# Altium footprint library L21.PcbLib: 9 footprints
Each footprint in its own frame and in the unit in brackets; x right, y up, seen from the top. Pads: shape width x height; smd on the part's side, far side on the other; paste and mask are expansions set on the pad; w line width, h text height; cw(c..) or ccw(c..) is an arc to the next point about the centre after c.
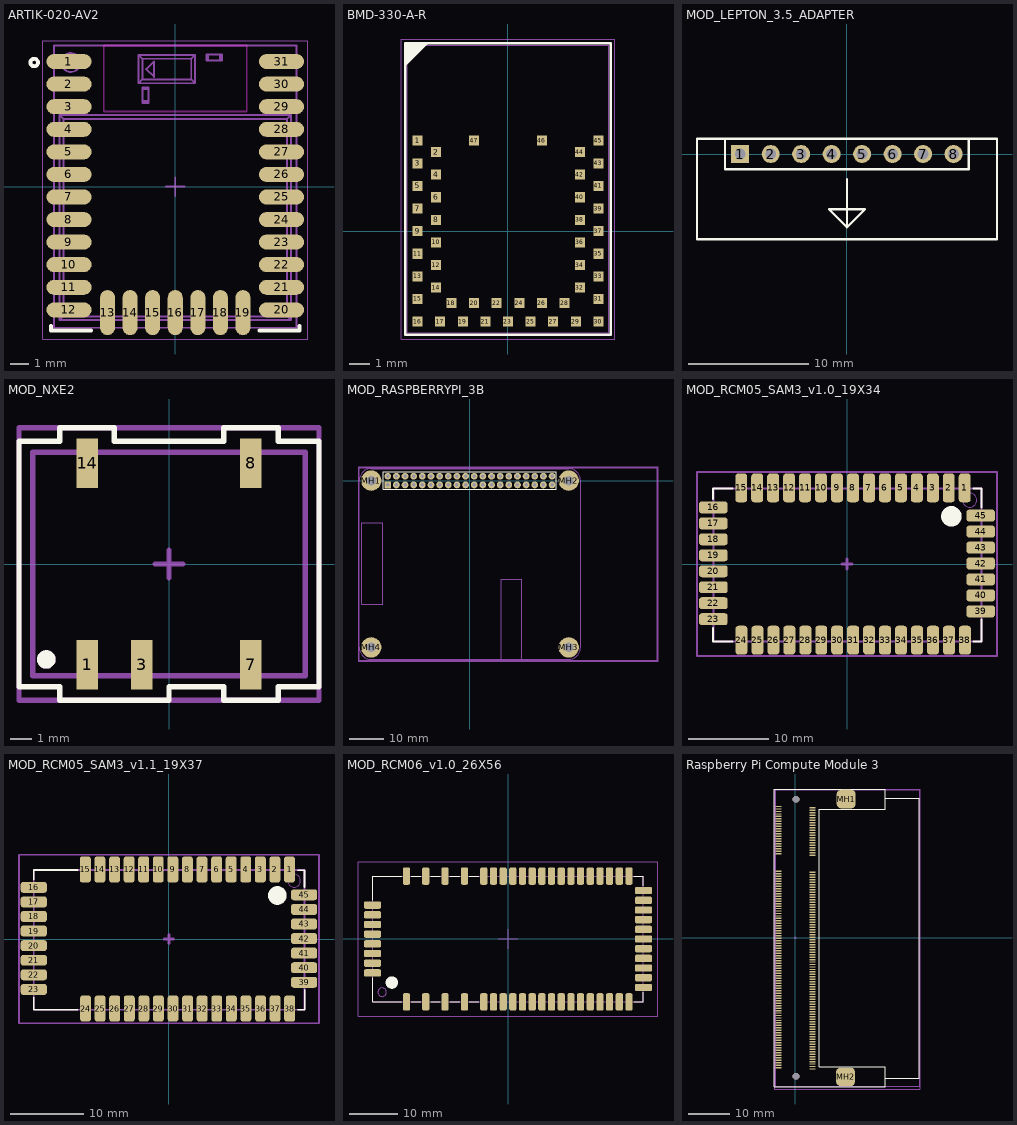
[diagram p0: the footprints below, top view; thin cyan lines are the x and y axes]

## ARTIK-020-AV2 [mm]
pads (31):
  oval 2.4x0.8 smd: 1(-5.65,6.65) 2(-5.65,5.45) 3(-5.65,4.25) 4(-5.65,3.05) 5(-5.65,1.85) 6(-5.65,0.65) 7(-5.65,-0.55) 8(-5.65,-1.75) 9(-5.65,-2.95) 10(-5.65,-4.15) 11(-5.65,-5.35) 12(-5.65,-6.55) 20(5.65,-6.55) 21(5.65,-5.35) 22(5.65,-4.15) 23(5.65,-2.95) 24(5.65,-1.75) 25(5.65,-0.55) 26(5.65,0.65) 27(5.65,1.85) 28(5.65,3.05) 29(5.65,4.25) 30(5.65,5.45) 31(5.65,6.65)
  oval 0.8x2.4 smd: 13(-3.6,-6.7) 14(-2.4,-6.7) 15(-1.2,-6.7) 16(0,-6.7) 17(1.2,-6.7) 18(2.4,-6.7) 19(3.6,-6.7)
Top Overlay:
  circle w0.2: c-7.5,6.6 r0.2
  lines w0.2: -6.6,-7.4 -6.6,-7.65 -4.475,-7.65 ; 4.475,-7.65 6.6,-7.65 6.6,-7.4
Keep-Out Layer:
  lines w0.1: -3.8,4 3.8,4 3.8,7.5 -3.8,7.5 -3.8,4
Assembly Top:
  circle w0.1: c-5.55,6.6 r0.5
  lines w0.1: -6.15,-7.1 -6.15,3.8 ; -6.15,-7.1 -5.95,-6.9 ; -6.15,-7.1 6.15,-7.1 ; -6.15,3.8 -5.95,3.6 ; -6.15,3.8 6.15,3.8 ; -5.95,-6.9 -5.95,3.6 ; -5.95,-6.9 5.95,-6.9 ; -5.95,3.6 5.95,3.6 ; -1.95,5.5 -1.75,5.7 ; -1.95,5.5 -1.95,7 ; -1.95,5.5 1.05,5.5 ; -1.95,7 -1.75,6.8 ; -1.95,7 1.05,7 ; -1.75,5.7 -1.75,6.8 ; -1.75,5.7 0.85,5.7 ; -1.75,6.8 0.85,6.8 ; -1.737,4.546 -1.737,4.446 -1.418,4.446 -1.418,4.546 ; -1.737,4.546 -1.418,4.546 ; -1.737,4.546 -1.737,5.181 ; -1.737,5.181 -1.737,5.281 -1.418,5.281 -1.418,5.181 ; -1.737,5.181 -1.418,5.181 ; -1.418,4.546 -1.418,5.181 ; 0.85,5.7 1.05,5.5 ; 0.85,5.7 0.85,6.8 ; 0.85,6.8 1.05,7 ; 1.05,5.5 1.05,7 ; 1.747,6.7 1.647,6.7 1.647,7.019 1.747,7.019 ; 1.747,6.7 1.747,7.019 ; 1.747,6.7 2.382,6.7 ; 1.747,7.019 2.382,7.019 ; 2.382,6.7 2.482,6.7 2.482,7.019 2.382,7.019 ; 2.382,6.7 2.382,7.019 ; 5.95,-6.9 5.95,3.6 ; 5.95,-6.9 6.15,-7.1 ; 5.95,3.6 6.15,3.8 ; 6.15,-7.1 6.15,3.8 ; -6.45,-7.5 -6.45,7.5 6.45,7.5 6.45,-7.5 -6.45,-7.5 ; -1.545,6.25 -1.129,6.666 -1.129,5.834 -1.545,6.25
Courtyard Top:
  lines w0.05: -7.035,-8.1 7.035,-8.1 7.035,7.75 -7.035,7.75 -7.035,-8.1
  lines w0.1: -0.5,0 0.5,0 ; 0,-0.5 0,0.5
3D body "User Library-BGM111-1.STEP": height 2.21, standoff 0, extent -6.45,-7.525 6.45,7.475

## BMD-330-A-R [mm] "Bluetooth Modulee (802.15.1) BMD-330-A-R"
pads (47):
  rect 0.49x0.49 smd: 1(-4.4,4.4) 2(-3.5,3.85) 3(-4.4,3.3) 4(-3.5,2.75) 5(-4.4,2.2) 6(-3.5,1.65) 7(-4.4,1.1) 8(-3.5,0.55) 9(-4.4,0) 10(-3.5,-0.55) 11(-4.4,-1.1) 12(-3.5,-1.65) 13(-4.4,-2.2) 14(-3.5,-2.75) 15(-4.4,-3.3) 16(-4.4,-4.4) 17(-3.3,-4.4) 18(-2.75,-3.5) 19(-2.2,-4.4) 20(-1.65,-3.5) 21(-1.1,-4.4) 22(-0.55,-3.5) 23(0,-4.4) 24(0.55,-3.5) 25(1.1,-4.4) 26(1.65,-3.5) 27(2.2,-4.4) 28(2.75,-3.5) 29(3.3,-4.4) 30(4.4,-4.4) 31(4.4,-3.3) 32(3.5,-2.75) 33(4.4,-2.2) 34(3.5,-1.65) 35(4.4,-1.1) 36(3.5,-0.55) 37(4.4,0) 38(3.5,0.55) 39(4.4,1.1) 40(3.5,1.65) 41(4.4,2.2) 42(3.5,2.75) 43(4.4,3.3) 44(3.5,3.85) 45(4.4,4.4) 46(1.65,4.4) 47(-1.65,4.4)
Top Overlay:
  region: -4.975,8.125 -3.975,9.125 -4.975,9.125
  lines w0.127: -4.967,8.123 -3.967,9.123 ; -5,-5.05 -5,9.15 5,9.15 5,-5.05 -5,-5.05
Assembly Top:
  lines w0.05: -4.9,-4.95 -4.9,9.05 4.9,9.05 4.9,-4.95 -4.9,-4.95
3D Body Top:
  lines w0.05: -5.2,-5.25 -5.2,9.35 5.2,9.35 5.2,-5.25 -5.2,-5.25
Multi-Layer:
  pour cut-out: -4.9,4.65 4.9,4.65 4.9,9.05 -4.9,9.05
3D body "BMD-300_assembly.STEP": height 1.89, standoff 0.05, extent -4.9,-4.95 4.9,9.05

## MOD_LEPTON_3.5_ADAPTER [mm]
pads (8):
  rect 1.5x1.5 hole 0.9: 1(-8.89,0)
  round 1.5 hole 0.9: 2(-6.35,0) 3(-3.81,0) 4(-1.27,0) 5(1.27,0) 6(3.81,0) 7(6.35,0) 8(8.89,0)
Top Overlay:
  lines w0.2: 0.01,-2.1 0.01,-6.1 ; -10.16,1.27 10.16,1.27 ; -10.16,1.27 -10.16,-1.27 10.16,-1.27 10.16,1.27 ; -10.16,1.27 -12.49,1.27 -12.49,-7.1 12.51,-7.1 12.51,1.27 10.16,1.27 ; 0.01,-6.1 -1.49,-4.6 1.51,-4.6 0.01,-6.1
Mechanical 17:
  text "'.Designator'" at -9.282,-0.479 h1
Mechanical 19:
  text "'.Comment'" at -9.282,-0.479 h1
3D body "User Library-Header _Fem_1X8.step": height 8.5, standoff -3.2, extent -10.414,-1.27 10.406,1.27
3D body "LeptonAdaptor.step": height 32.7, standoff 2.64, extent -12.5,-7.112 12.5,1.314

## MOD_NXE2 [mm]
pads (5):
  rect 1x2.3 smd: 1(-3.81,-4.7) 3(-1.27,-4.7) 7(3.81,-4.7) 8(3.81,4.7) 14(-3.81,4.7)
Top Overlay:
  circle w0.5: c-5.715,-4.445 r0.18
  lines w0.254: -6.985,-5.715 -5.08,-5.715 -5.08,-6.35 0,-6.35 0,-5.715 2.54,-5.715 2.54,-6.35 5.08,-6.35 5.08,-5.715 6.985,-5.715 6.985,5.715 5.08,5.715 5.08,6.35 2.54,6.35 2.54,5.715 -2.54,5.715 -2.54,6.35 -5.08,6.35 -5.08,5.715 -6.985,5.715 -6.985,-5.715
Mechanical 13:
  circle w0.5: c-5.715,-4.445 r0.18
  lines w0.254: -6.35,-5.207 -6.35,5.207 6.35,5.207 6.35,-5.207 -6.35,-5.207
Mechanical 15:
  lines w0.254: -0.635,0 0.635,0 ; 0,-0.635 0,0.635 ; -6.985,-6.35 6.985,-6.35 6.985,6.35 -6.985,6.35 -6.985,-6.35
Mechanical 17:
  text "'.Designator'" at -2.54,-0.254 h0.64
Mechanical 19:
  text "'.Comment'" at -2.54,-1.524 h0.64
3D body "mps_dcdc_nxe2s_mc_a.step": height 4.41, standoff 0, extent -6.35,-5.207 6.35,5.207

## MOD_RASPBERRYPI_3B [mm]
pads (44):
  rect 2x2 hole 1.02: 1(-24.13,-1.27)
  round 2 hole 1.02: 2(-24.13,1.27) 3(-21.59,-1.27) 4(-21.59,1.27) 5(-19.05,-1.27) 6(-19.05,1.27) 7(-16.51,-1.27) 8(-16.51,1.27) 9(-13.97,-1.27) 10(-13.97,1.27) 11(-11.43,-1.27) 12(-11.43,1.27) 13(-8.89,-1.27) 14(-8.89,1.27) 15(-6.35,-1.27) 16(-6.35,1.27) 17(-3.81,-1.27) 18(-3.81,1.27) 19(-1.27,-1.27) 20(-1.27,1.27) 21(1.27,-1.27) 22(1.27,1.27) 23(3.81,-1.27) 24(3.81,1.27) 25(6.35,-1.27) 26(6.35,1.27) 27(8.89,-1.27) 28(8.89,1.27) 29(11.43,-1.27) 30(11.43,1.27) 31(13.97,-1.27) 32(13.97,1.27) 33(16.51,-1.27) 34(16.51,1.27) 35(19.05,-1.27) 36(19.05,1.27) 37(21.59,-1.27) 38(21.59,1.27) 39(24.13,-1.27) 40(24.13,1.27)
  round 6 hole 2.75: MH1(-29,0) MH2(29,0) MH3(29,-49) MH4(-29,-49)
Top Overlay:
  lines w0.2: -25.4,-2.54 -25.4,2.54 -20.955,2.54 25.4,2.54 25.4,-2.54 -25.4,-2.54
Mechanical 13:
  lines w0.127: -32.715,-52.75 -32.715,3.75 55,3.75 55,-52.75 -32.715,-52.75
  lines w0.15: -32.5,-49 ccw(c-29,-49) -29,-52.5 29,-52.5 ccw(c29,-49) 32.5,-49 32.5,0 ccw(c29,0) 29,3.5 -29,3.5 ccw(c-29,0) -32.5,0 -32.5,-49 ; -31.8,-36.322 -31.8,-12.319 -25.654,-12.319 -25.654,-36.322 -31.8,-36.322 ; 9.271,-52.959 9.271,-28.956 15.24,-28.956 15.24,-52.959 9.271,-52.959
  text "CAMERA" at 13.081,-45.593 h1.52
  text "DISPLAY" at -28.067,-30.099 h1.52
Mechanical 15:
  lines w0.127: -32.868,-53 55.25,-53 55.25,4 -32.868,4 -32.868,-53
Mechanical 17:
  text "'.Designator'" at -25.25,-53.25 h1
Mechanical 19:
  text "'.Comment'" at -13.5,-53.25 h1
3D body "Raspberry Pi 3.STEP": height 8.49, standoff -10.1, extent -34.773,-53.831 54.864,3.48

## MOD_RCM05_SAM3_v1.0_19X34 [mm]
pads (45):
  rrect50% 1.5x3.6 smd paste-2.54: 1(14.75,9.538) 2(12.75,9.538) 3(10.75,9.538) 4(8.75,9.538) 5(6.75,9.538) 6(4.75,9.538) 7(2.75,9.538) 8(0.75,9.538) 9(-1.25,9.538) 10(-3.25,9.538) 11(-5.25,9.538) 12(-7.25,9.538) 13(-9.25,9.538) 14(-11.25,9.538) 15(-13.25,9.538) 24(-13.225,-9.538) 25(-11.225,-9.537) 26(-9.225,-9.538) 27(-7.225,-9.538) 28(-5.225,-9.538) 29(-3.225,-9.538) 30(-1.225,-9.537) 31(0.775,-9.538) 32(2.775,-9.538) 33(4.775,-9.538) 34(6.775,-9.538) 35(8.775,-9.538) 36(10.775,-9.538) 37(12.775,-9.538) 38(14.775,-9.538)
  rrect50% 3.6x1.5 smd paste-2.54: 16(-16.75,7.087) 17(-16.75,5.087) 18(-16.75,3.087) 19(-16.75,1.087) 20(-16.75,-0.913) 21(-16.75,-2.913) 22(-16.75,-4.913) 23(-16.75,-6.913) 39(16.75,-5.937) 40(16.75,-3.938) 41(16.75,-1.938) 42(16.75,0.062) 43(16.75,2.063) 44(16.75,4.062) 45(16.75,6.062)
Top Overlay:
  circle w1.27: c13.081,5.969 r0.648
  lines w0.254: -16.806,8.128 -16.806,9.441 ; -16.806,9.467 -14.351,9.467 ; -16.781,-8.001 -16.781,-9.711 -14.351,-9.711 ; 15.875,-9.711 16.839,-9.711 16.839,-6.985 ; 15.875,9.434 16.828,9.434 16.828,7.112
Mechanical 13:
  circle w0.127: c15.367,8.001 r0.889
  lines w0.254: -16.75,9.467 16.8,9.467 ; -16.75,9.471 -16.75,-9.711 16.825,-9.711 16.825,9.446
Mechanical 15:
  lines w0.254: -18.796,-11.557 -18.796,11.557 18.796,11.557 18.796,-11.557 -18.796,-11.557
  lines w0.381: -0.635,0 0.635,0 ; 0,-0.635 0,0.635
Mechanical 17:
  text ".Designator" at -6.985,-1.905 h3.81
Mechanical 19:
  text "'.Comment'" at -9.525,-1.905 h3.81
3D body "RCM-05-SAM3.step": height 2.34, standoff 0.08, extent -17.739,-10.534 17.793,10.466

## MOD_RCM05_SAM3_v1.1_19X37 [mm]
pads (45):
  rrect50% 1.5x3.6 smd paste-2.54: 1(16.535,9.538) 2(14.535,9.538) 3(12.535,9.538) 4(10.535,9.538) 5(8.535,9.538) 6(6.535,9.538) 7(4.535,9.538) 8(2.535,9.538) 9(0.535,9.538) 10(-1.465,9.538) 11(-3.465,9.538) 12(-5.465,9.538) 13(-7.465,9.538) 14(-9.465,9.538) 15(-11.465,9.538) 24(-11.44,-9.537) 25(-9.44,-9.537) 26(-7.44,-9.537) 27(-5.44,-9.537) 28(-3.44,-9.537) 29(-1.44,-9.537) 30(0.56,-9.537) 31(2.56,-9.537) 32(4.56,-9.537) 33(6.56,-9.537) 34(8.56,-9.537) 35(10.56,-9.537) 36(12.56,-9.537) 37(14.56,-9.537) 38(16.56,-9.537)
  rrect50% 3.6x1.5 smd paste-2.54: 16(-18.535,7.087) 17(-18.535,5.087) 18(-18.535,3.087) 19(-18.535,1.087) 20(-18.535,-0.913) 21(-18.535,-2.913) 22(-18.535,-4.913) 23(-18.535,-6.913) 39(18.535,-5.937) 40(18.535,-3.937) 41(18.535,-1.937) 42(18.535,0.063) 43(18.535,2.063) 44(18.535,4.063) 45(18.535,6.063)
Top Overlay:
  circle w1.27: c14.866,5.969 r0.648
  lines w0.254: -18.54,-8.001 -18.54,-9.711 -12.566,-9.711 ; -18.54,8.128 -18.54,9.467 -12.566,9.467 ; 17.66,-9.711 18.624,-9.711 18.624,-6.985 ; 17.66,9.434 18.613,9.434 18.613,7.112
Mechanical 13:
  circle w0.127: c17.152,8.001 r0.889
  lines w0.254: 18.585,9.467 -18.535,9.467 -18.535,-9.711 18.61,-9.711 18.61,9.446
Mechanical 15:
  lines w0.254: -20.567,-11.557 -20.567,11.557 20.581,11.557 20.581,-11.557 -20.567,-11.557
  lines w0.381: -0.635,0 0.635,0 ; 0,-0.635 0,0.635
Mechanical 17:
  text "'.Designator'" at -17.145,2.286 h2.54
Mechanical 19:
  text "'.Comment'" at -17.272,-2.667 h2.54
3D body "RCM-05-SAM3.step": height 2.6, standoff 0.08, extent -19.51,-10.533 19.578,10.467

## MOD_RCM06_v1.0_26X56 [mm]
pads (59):
  rrect50% 1.5x3.6 smd paste-100: 1(-21,-13) 2(-17,-13) 3(-13,-13) 4(-9,-13) 5(-5,-13) 6(-3,-13) 7(-1,-13) 8(1,-13) 9(3,-13) 10(5,-13) 11(7,-13) 12(9,-13) 13(11,-13) 14(13,-13) 15(15,-13) 16(17,-13) 17(19,-13) 18(21,-13) 19(23,-13) 20(25,-13) 32(25,13) 33(23,13) 34(21,13) 35(19,13) 36(17,13) 37(15,13) 38(13,13) 39(11,13) 40(9,13) 41(7,13) 42(5,13) 43(3,13) 44(1,13) 45(-1,13) 46(-3,13) 47(-5,13) 48(-9,13) 49(-13,13) 50(-17,13) 51(-21,13)
  rrect50% 3.6x1.5 smd paste-100: 21(28,-10) 22(28,-8) 23(28,-6) 24(28,-4) 25(28,-2) 26(28,0) 27(28,2) 28(28,4) 29(28,6) 30(28,8) 31(28,10) 52(-28,7) 53(-28,5) 54(-28,3) 55(-28,1) 56(-28,-1) 57(-28,-3) 58(-28,-5) 59(-28,-7)
Top Overlay:
  circle w1.27: c-24,-9 r0.648
  lines w0.254: -28,-8 -28,-13 -22,-13 ; -28,8 -28,13 -22,13 ; -20,-13 -18,-13 ; -20,13 -18,13 ; -16,-13 -14,-13 ; -16,13 -14,13 ; -12,-13 -10,-13 ; -12,13 -10,13 ; -8,-13 -6,-13 ; -8,13 -6,13 ; 26,-13 28,-13 28,-11 ; 26,13 28,13 28,11
Mechanical 13:
  circle w0.127: c-26,-11 r0.889
  lines w0.254: -28,-13 -28,13 28,13 28,-13 -28,-13
Mechanical 15:
  lines w0.254: -2,0 2,0 ; 0,-2 0,2 ; -31,-16 -31,16 31,16 31,-16 -31,-16
Mechanical 17:
  text "'.Designator'" at -20,0 h3.81
Mechanical 19:
  text "'.Comment'" at -20,-8 h3.81
3D body "module_rcm06.step": height 3.49, standoff 0.01, extent -29,-14 29,14

## Raspberry Pi Compute Module 3 [mm]
pads (202):
  rrect50% 1.5x0.35 smd mask+0.07: 1(-4.1,31.65) 2(4.1,31.35) 3(-4.1,31.05) 4(4.1,30.75) 5(-4.1,30.45) 6(4.1,30.15) 7(-4.1,29.85) 8(4.1,29.55) 9(-4.1,29.25) 10(4.1,28.95) 11(-4.1,28.65) 12(4.1,28.35) 13(-4.1,28.05) 14(4.1,27.75) 15(-4.1,27.45) 16(4.1,27.15) 17(-4.1,26.85) 18(4.1,26.55) 19(-4.1,26.25) 20(4.1,25.95) 21(-4.1,25.65) 22(4.1,25.35) 23(-4.1,25.05) 24(4.1,24.75) 25(-4.1,24.45) 26(4.1,24.15) 27(-4.1,23.85) 28(4.1,23.55) 29(-4.1,23.25) 30(4.1,22.95) 31(-4.1,22.65) 32(4.1,22.35) 33(-4.1,22.05) 34(4.1,21.75) 35(-4.1,21.45) 36(4.1,21.15) 37(-4.1,20.85) 38(4.1,20.55) 39(-4.1,20.25) 40(4.1,19.95) 41(-4.1,16.05) 42(4.1,15.75) 43(-4.1,15.45) 44(4.1,15.15) 45(-4.1,14.85) 46(4.1,14.55) 47(-4.1,14.25) 48(4.1,13.95) 49(-4.1,13.65) 50(4.1,13.35) 51(-4.1,13.05) 52(4.1,12.75) 53(-4.1,12.45) 54(4.1,12.15) 55(-4.1,11.85) 56(4.1,11.55) 57(-4.1,11.25) 58(4.1,10.95) 59(-4.1,10.65) 60(4.1,10.35) 61(-4.1,10.05) 62(4.1,9.75) 63(-4.1,9.45) 64(4.1,9.15) 65(-4.1,8.85) 66(4.1,8.55) 67(-4.1,8.25) 68(4.1,7.95) 69(-4.1,7.65) 70(4.1,7.35) 71(-4.1,7.05) 72(4.1,6.75) 73(-4.1,6.45) 74(4.1,6.15) 75(-4.1,5.85) 76(4.1,5.55) 77(-4.1,5.25) 78(4.1,4.95) 79(-4.1,4.65) 80(4.1,4.35) 81(-4.1,4.05) 82(4.1,3.75) 83(-4.1,3.45) 84(4.1,3.15) 85(-4.1,2.85) 86(4.1,2.55) 87(-4.1,2.25) 88(4.1,1.95) 89(-4.1,1.65) 90(4.1,1.35) 91(-4.1,1.05) 92(4.1,0.75) 93(-4.1,0.45) 94(4.1,0.15) 95(-4.1,-0.15) 96(4.1,-0.45) 97(-4.1,-0.75) 98(4.1,-1.05) 99(-4.1,-1.35) 100(4.1,-1.65) 101(-4.1,-1.95) 102(4.1,-2.25) 103(-4.1,-2.55) 104(4.1,-2.85) 105(-4.1,-3.15) 106(4.1,-3.45) 107(-4.1,-3.75) 108(4.1,-4.05) 109(-4.1,-4.35) 110(4.1,-4.65) 111(-4.1,-4.95) 112(4.1,-5.25) 113(-4.1,-5.55) 114(4.1,-5.85) 115(-4.1,-6.15) 116(4.1,-6.45) 117(-4.1,-6.75) 118(4.1,-7.05) 119(-4.1,-7.35) 120(4.1,-7.65) 121(-4.1,-7.95) 122(4.1,-8.25) 123(-4.1,-8.55) 124(4.1,-8.85) 125(-4.1,-9.15) 126(4.1,-9.45) 127(-4.1,-9.75) 128(4.1,-10.05) 129(-4.1,-10.35) 130(4.1,-10.65) 131(-4.1,-10.95) 132(4.1,-11.25) 133(-4.1,-11.55) 134(4.1,-11.85) 135(-4.1,-12.15) 136(4.1,-12.45) 137(-4.1,-12.75) 138(4.1,-13.05) 139(-4.1,-13.35) 140(4.1,-13.65) 141(-4.1,-13.95) 142(4.1,-14.25) 143(-4.1,-14.55) 144(4.1,-14.85) 145(-4.1,-15.15) 146(4.1,-15.45) 147(-4.1,-15.75) 148(4.1,-16.05) 149(-4.1,-16.35) 150(4.1,-16.65) 151(-4.1,-16.95) 152(4.1,-17.25) 153(-4.1,-17.55) 154(4.1,-17.85) 155(-4.1,-18.15) 156(4.1,-18.45) 157(-4.1,-18.75) 158(4.1,-19.05) 159(-4.1,-19.35) 160(4.1,-19.65) 161(-4.1,-19.95) 162(4.1,-20.25) 163(-4.1,-20.55) 164(4.1,-20.85) 165(-4.1,-21.15) 166(4.1,-21.45) 167(-4.1,-21.75) 168(4.1,-22.05) 169(-4.1,-22.35) 170(4.1,-22.65) 171(-4.1,-22.95) 172(4.1,-23.25) 173(-4.1,-23.55) 174(4.1,-23.85) 175(-4.1,-24.15) 176(4.1,-24.45) 177(-4.1,-24.75) 178(4.1,-25.05) 179(-4.1,-25.35) 180(4.1,-25.65) 181(-4.1,-25.95) 182(4.1,-26.25) 183(-4.1,-26.55) 184(4.1,-26.85) 185(-4.1,-27.15) 186(4.1,-27.45) 187(-4.1,-27.75) 188(4.1,-28.05) 189(-4.1,-28.35) 190(4.1,-28.65) 191(-4.1,-28.95) 192(4.1,-29.25) 193(-4.1,-29.55) 194(4.1,-29.85) 195(-4.1,-30.15) 196(4.1,-30.45) 197(-4.1,-30.75) 198(4.1,-31.05) 199(-4.1,-31.35) 200(4.1,-31.65)
  rrect50% 4.6x4.5 smd mask+0.07: MH1(12.225,33.45) MH2(12.075,-33.525)
via 0.125,33.4 diameter 1.6 hole 1.6
via 0.125,-33.4 diameter 1.6 hole 1.6
Top Overlay:
  lines w0.2: 21.65,-33.925 21.65,-31.125 5.675,-31.125 5.675,31.025 21.675,31.025 21.675,33.675 ; 21.65,-33.925 29.875,-33.925 29.875,33.675 21.675,33.675 ; 21.65,-33.925 21.65,-35.95 -5.1,-35.95 -5.1,35.875 21.675,35.875 21.675,35.775 21.675,33.675
Mechanical 13:
  lines w0.051: -4.85,-35.761 -4.85,35.739 29.875,35.739 29.875,-35.761 -4.85,-35.761
Mechanical 15:
  lines w0.127: -0.254,0 0.254,0 ; 0,-0.254 0,0.254 ; -5.1,-36.475 -5.1,35.825 29.95,35.825 29.95,-36.475 -5.1,-36.475
3D body "User Library-compute_module.step": height 4, standoff 2.5, extent -0.125,-33.925 29.875,33.675
3D body "c-1473149-4-k2-3d.stp": height 5.76, standoff -0.66, extent -4.86,-35.761 21.68,35.739